# Altium footprint library PCB_Connector.PcbLib: 86 footprints (part 6 of 6)
Each footprint in its own frame and in the unit in brackets; x right, y up, seen from the top. Pads: shape width x height; smd on the part's side, far side on the other; paste and mask are expansions set on the pad; w line width, h text height; cw(c..) or ccw(c..) is an arc to the next point about the centre after c.
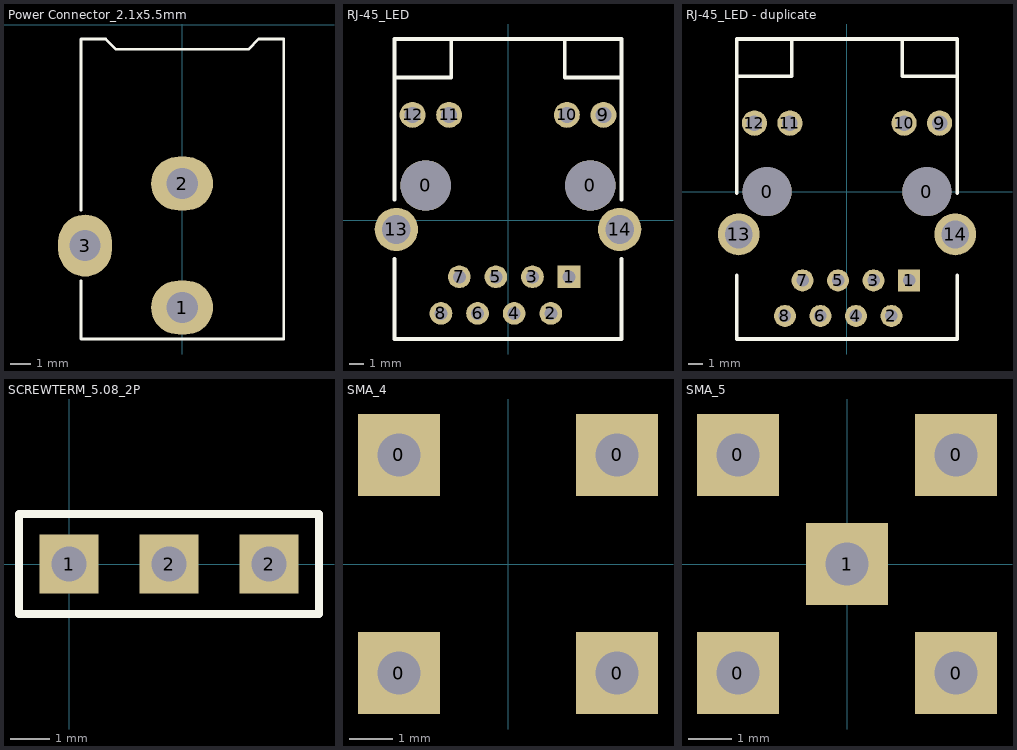
[diagram p5: the footprints below, top view; thin cyan lines are the x and y axes]

## Power Connector_2.1x5.5mm [mm] "Power Connector, 2.1mm ID, 5.5mm OD"
height 11
pads (3):
  oval 3x2.6 hole 1.511: 1(0,-13.7) 2(0,-7.7)
  oval 2.6x3 hole 1.511: 3(-4.7,-10.7)
Top Overlay:
  lines w0.127: -4.9,-12.4 -4.9,-15.225 4.925,-15.225 4.925,-0.7 3.7,-0.7 3.2,-1.2 -3.2,-1.2 -3.7,-0.7 -4.9,-0.7 -4.9,-9
Mechanical 13:
  lines w0.076: -4.9,-12.4 -4.9,-15.225 4.925,-15.225 4.925,-0.7 3.7,-0.7 3.2,-1.2 -3.2,-1.2 -3.7,-0.7 -4.9,-0.7 -4.9,-9
3D body: height 11, standoff -3.5, extent -4.9,-14.1 4.5,0

## RJ-45_LED [mm]
pads (16):
  round 3.5 hole 3.5: 0(-5.715,2.408) 0(5.715,2.408)
  rect 1.575x1.575 hole 0.9: 1(4.239,-3.928)
  round 1.575 hole 0.9: 2(2.969,-6.468) 3(1.699,-3.928) 4(0.429,-6.468) 5(-0.841,-3.928) 6(-2.111,-6.468) 7(-3.381,-3.928) 8(-4.651,-6.468)
  round 1.8 hole 1.1: 9(6.625,7.308) 10(4.085,7.308) 11(-4.085,7.308) 12(-6.625,7.308)
  round 3 hole 2: 13(-7.75,-0.642) 14(7.75,-0.642)
Top Overlay:
  lines w0.254: -7.874,-2.667 -7.874,-8.246 7.874,-8.246 7.874,-2.667 ; -7.874,12.573 7.874,12.573 ; -7.871,1.415 -7.871,12.573 ; -7.871,9.906 -3.937,9.906 -3.937,12.573 ; 3.937,12.573 3.937,9.906 7.871,9.906 ; 7.877,1.415 7.877,12.573
3D body: height 13.59, standoff -2.91, extent -7.937,-8.865 7.943,12.535

## RJ-45_LED - duplicate [mm]
pads (16):
  round 3.5 hole 3.5: 0(-5.715,0) 0(5.715,0)
  rect 1.575x1.575 hole 0.9: 1(4.44,-6.35)
  round 1.575 hole 0.9: 2(3.18,-8.89) 3(1.9,-6.35) 4(0.64,-8.89) 5(-0.64,-6.35) 6(-1.9,-8.89) 7(-3.18,-6.35) 8(-4.44,-8.89)
  round 1.8 hole 1.1: 9(6.625,4.9) 10(4.085,4.9) 11(-4.085,4.9) 12(-6.625,4.9)
  round 3 hole 2: 13(-7.745,-3.05) 14(7.745,-3.05)
Top Overlay:
  lines w0.254: -7.874,-5.969 -7.874,-10.541 7.874,-10.541 7.874,-5.969 ; -7.874,-0.127 -7.874,10.922 7.874,10.922 7.874,-0.127 ; -7.871,8.253 -3.937,8.253 -3.937,10.922 ; 3.937,10.92 3.937,8.253 7.871,8.253
3D body: height 13.59, standoff -2.91, extent -7.925,-10.471 7.955,10.929

## SCREWTERM_5.08_2P [mm] "SCREW TERMINAL"
pads (3):
  rect 1.5x1.5 hole 0.9: 1(0,0) 2(2.54,0) 2(5.08,0)
Top Overlay:
  lines w0.2: -1.27,-1.27 -1.27,1.27 6.35,1.27 6.35,-1.27 -1.27,-1.27
3D body: height 16.74, standoff -0.96, extent -5.605,-5.246 4.995,5.055

## SMA_4 [mm]
pads (4):
  rect 1.905x1.905 hole 1: 0(-2.54,-2.54) 0(-2.54,2.54) 0(2.54,-2.54) 0(2.54,2.54)
3D body: height 9.55, standoff -3.94, extent -11.608,-3.175 3.2,3.175
3D body: height 48.85, standoff 1.99, extent -25.121,-4.504 -6.871,4.496

## SMA_5 [mm]
pads (5):
  rect 1.905x1.905 hole 1: 0(-2.54,-2.54) 0(-2.54,2.54) 0(2.54,-2.54) 0(2.54,2.54) 1(0,0)
3D body: height 48.85, standoff 1.99, extent -25.121,-4.504 -6.871,4.496
3D body: height 9.55, standoff -3.94, extent -11.608,-3.175 3.2,3.175